# Altium integrated library GPDSE.IntLib: 634 symbols (part 7 of 7)
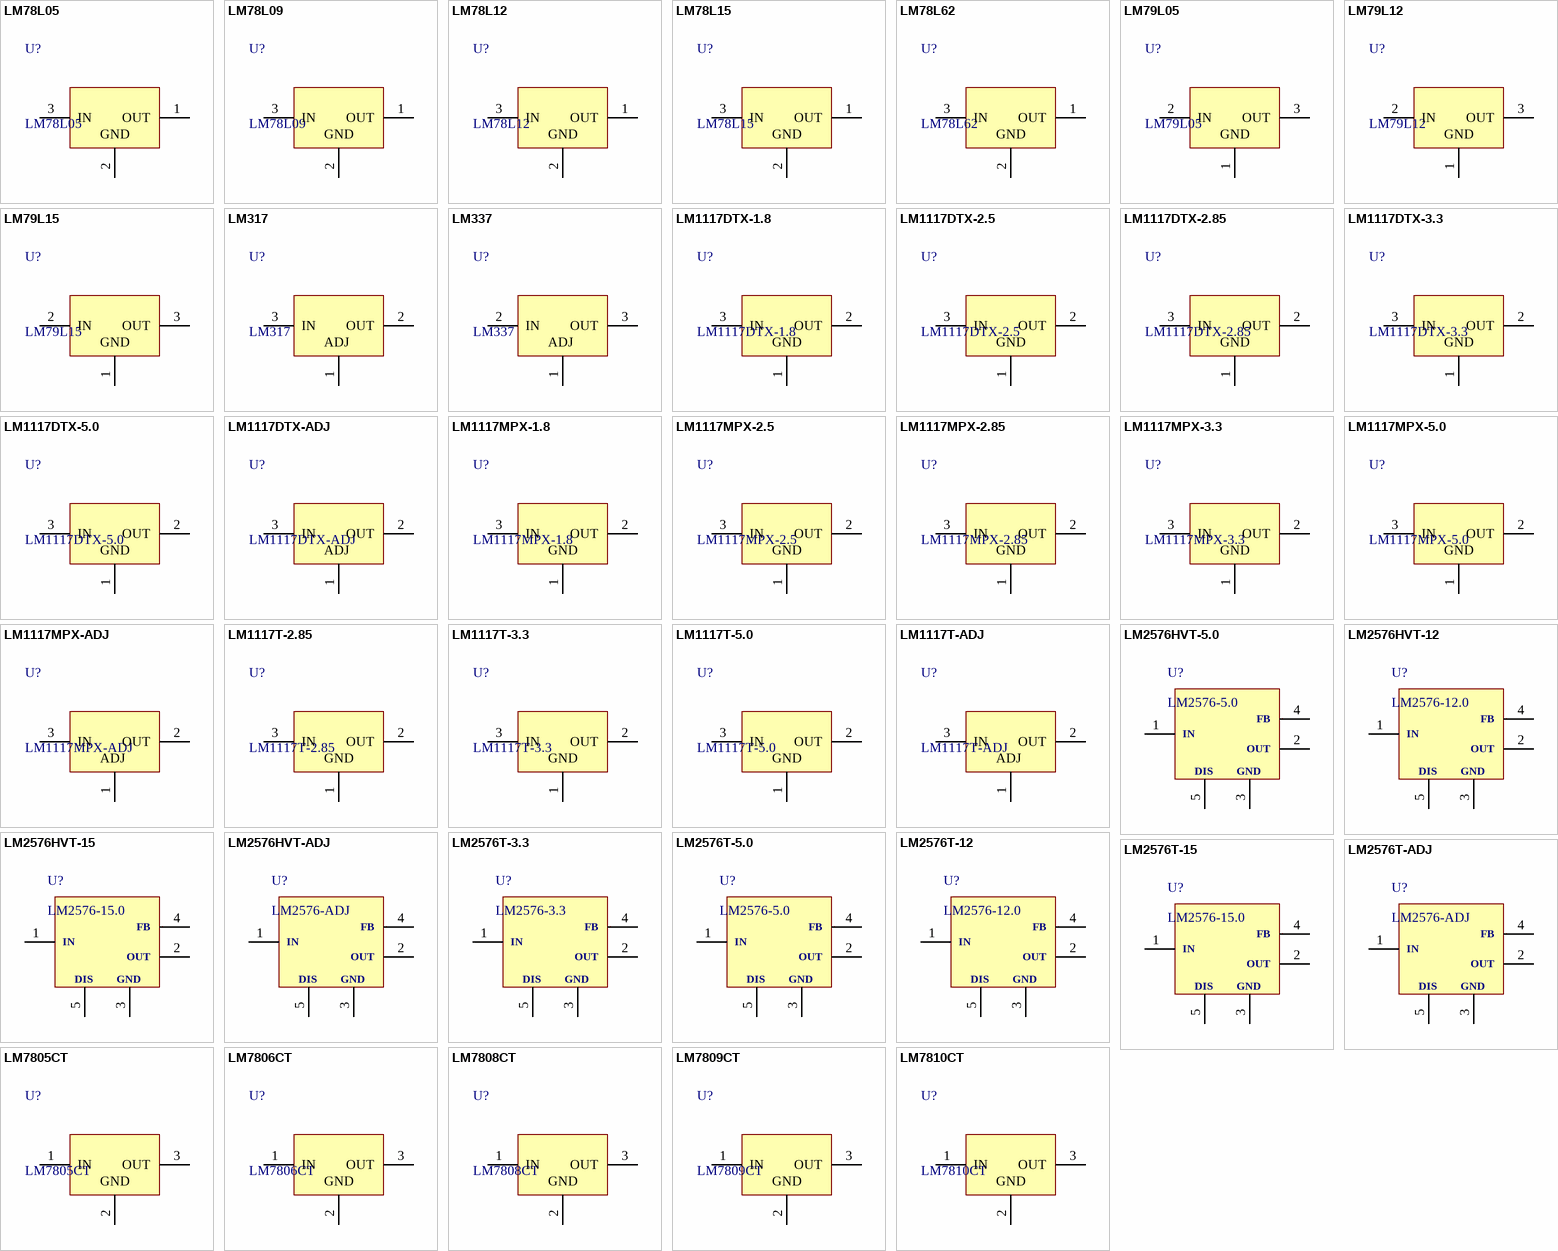
[diagram p41: symbols LM78L05 to LM7810CT]

## LM7806CT
designator U?
3-Terminal 1 A Positive 6 V Voltage Regulator
footprint TO-220/123 (TO, Thru-Hole, Vertical, Heatsink Mounted; 3 In-Line Leads; Pitch 2.54 mm)
pins: 1 IN, 2 GND, 3 OUT

## LM7808CT
designator U?
3-Terminal 1 A Positive 8 V Voltage Regulator
footprint TO-220/123 (TO, Thru-Hole, Vertical, Heatsink Mounted; 3 In-Line Leads; Pitch 2.54 mm)
pins: 1 IN, 2 GND, 3 OUT

## LM7809CT
designator U?
3-Terminal 1 A Positive 9 V Voltage Regulator
footprint TO-220/123 (TO, Thru-Hole, Vertical, Heatsink Mounted; 3 In-Line Leads; Pitch 2.54 mm)
pins: 1 IN, 2 GND, 3 OUT

## LM7810CT
designator U?
3-Terminal 1 A Positive 10 V Voltage Regulator
footprint TO-220/123 (TO, Thru-Hole, Vertical, Heatsink Mounted; 3 In-Line Leads; Pitch 2.54 mm)
pins: 1 IN, 2 GND, 3 OUT

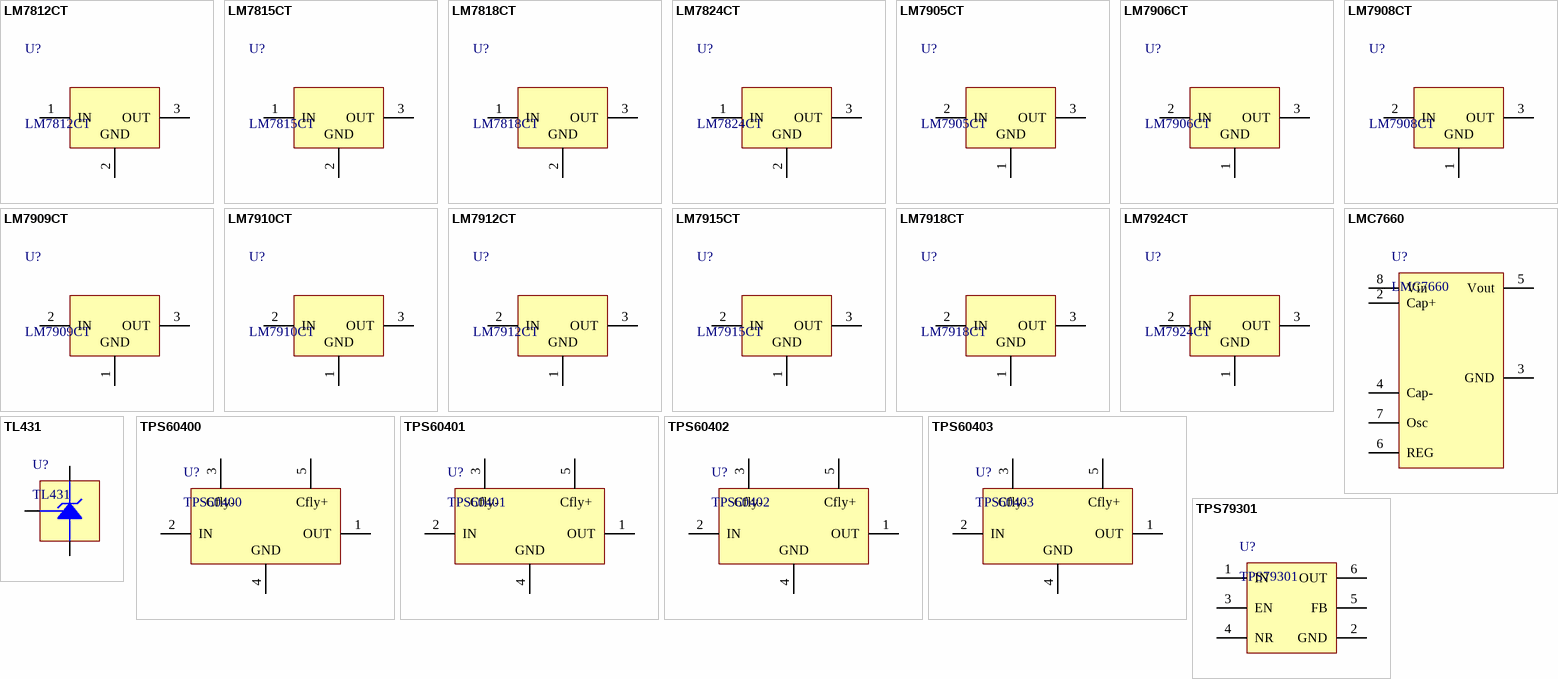
[diagram p33: symbols LM7812CT to TPS79301]

## LM7812CT
designator U?
3-Terminal 1 A Positive 12 V Voltage Regulator
footprint TO-220/123 (TO, Thru-Hole, Vertical, Heatsink Mounted; 3 In-Line Leads; Pitch 2.54 mm)
pins: 1 IN, 2 GND, 3 OUT

## LM7815CT
designator U?
3-Terminal 1 A Positive 15 V Voltage Regulator
footprint TO-220/123 (TO, Thru-Hole, Vertical, Heatsink Mounted; 3 In-Line Leads; Pitch 2.54 mm)
pins: 1 IN, 2 GND, 3 OUT

## LM7818CT
designator U?
3-Terminal 1 A Positive 18 V Voltage Regulator
footprint TO-220/123 (TO, Thru-Hole, Vertical, Heatsink Mounted; 3 In-Line Leads; Pitch 2.54 mm)
pins: 1 IN, 2 GND, 3 OUT

## LM7824CT
designator U?
3-Terminal 1 A Positive 24 V Voltage Regulator
footprint TO-220/123 (TO, Thru-Hole, Vertical, Heatsink Mounted; 3 In-Line Leads; Pitch 2.54 mm)
pins: 1 IN, 2 GND, 3 OUT

## LM7905CT
designator U?
3-Terminal 1 A Negative 5 V Voltage Regulator
footprint TO-220/123 (TO, Thru-Hole, Vertical, Heatsink Mounted; 3 In-Line Leads; Pitch 2.54 mm)
pins: 1 GND, 2 IN, 3 OUT

## LM7906CT
designator U?
3-Terminal 1 A Negative 6 V Voltage Regulator
footprint TO-220/123 (TO, Thru-Hole, Vertical, Heatsink Mounted; 3 In-Line Leads; Pitch 2.54 mm)
pins: 1 GND, 2 IN, 3 OUT

## LM7908CT
designator U?
3-Terminal 1 A Negative 8 V Voltage Regulator
footprint TO-220/123 (TO, Thru-Hole, Vertical, Heatsink Mounted; 3 In-Line Leads; Pitch 2.54 mm)
pins: 1 GND, 2 IN, 3 OUT

## LM7909CT
designator U?
3-Terminal 1 A Negative 9 V Voltage Regulator
footprint TO-220/123 (TO, Thru-Hole, Vertical, Heatsink Mounted; 3 In-Line Leads; Pitch 2.54 mm)
pins: 1 GND, 2 IN, 3 OUT

## LM7910CT
designator U?
3-Terminal 1 A Negative 10 V Voltage Regulator
footprint TO-220/123 (TO, Thru-Hole, Vertical, Heatsink Mounted; 3 In-Line Leads; Pitch 2.54 mm)
pins: 1 GND, 2 IN, 3 OUT

## LM7912CT
designator U?
3-Terminal 1 A Negative 12 V Voltage Regulator
footprint TO-220/123 (TO, Thru-Hole, Vertical, Heatsink Mounted; 3 In-Line Leads; Pitch 2.54 mm)
pins: 1 GND, 2 IN, 3 OUT

## LM7915CT
designator U?
3-Terminal 1 A Negative 15 V Voltage Regulator
footprint TO-220/123 (TO, Thru-Hole, Vertical, Heatsink Mounted; 3 In-Line Leads; Pitch 2.54 mm)
pins: 1 GND, 2 IN, 3 OUT

## LM7918CT
designator U?
3-Terminal 1 A Negative 18 V Voltage Regulator
footprint TO-220/123 (TO, Thru-Hole, Vertical, Heatsink Mounted; 3 In-Line Leads; Pitch 2.54 mm)
pins: 1 GND, 2 IN, 3 OUT

## LM7924CT
designator U?
3-Terminal 1 A Negative 24 V Voltage Regulator
footprint TO-220/123 (TO, Thru-Hole, Vertical, Heatsink Mounted; 3 In-Line Leads; Pitch 2.54 mm)
pins: 1 GND, 2 IN, 3 OUT

## LMC7660
designator U?
Switched Capacitor Voltage Converter
footprint DIP08-300(100) (DIP; 8 Leads; Row Spacing 7.62 mm; Pitch 2.54 mm)
footprint SOIC08-150(50) (SOIC 8 Leads; Row Spacing 3.81 mm; Pitch 1.27 mm; 3D André L´Hérault)
pins: 2 Cap+, 3 GND, 4 Cap-, 5 Vout, 6 REG, 7 Osc, 8 Vin

## TL431
designator U?
Precision Programmable Reference
footprint TO-92/123 (Transistor Outline Package, Case Style 92 123; 3D Sergey Atanov)
footprint SOT-23/3 (Small Outline Transistor 3 leads); pin to pad 1>2 2>3 3>1
footprint SOT-23/5 (Small Outline Transistor 5 leads); pin to pad 1>4 2>5
footprint SOIC08-150(50) (SOIC 8 Leads; Row Spacing 3.81 mm; Pitch 1.27 mm; 3D André L´Hérault); pin to pad 1>8 2>6 3>1
footprint SC-70/5 (Thin Shrink Small Outline Transistor Package 5 leads); pin to pad 1>3 2>5 3>1
footprint DIP08-300(100) (DIP; 8 Leads; Row Spacing 7.62 mm; Pitch 2.54 mm); pin to pad 1>8 2>6 3>1
pins: 1 REF, 2 A, 3 K

## TPS60400
designator U?
Unregulated 60-mA Charge Pump Voltage Inverter
footprint SOT-23/5 (Small Outline Transistor 5 leads)
pins: 1 OUT, 2 IN, 3 Cfly-, 4 GND, 5 Cfly+

## TPS60401
designator U?
Unregulated 60-mA Charge Pump Voltage Inverter
footprint SOT-23/5 (Small Outline Transistor 5 leads)
pins: 1 OUT, 2 IN, 3 Cfly-, 4 GND, 5 Cfly+

## TPS60402
designator U?
Unregulated 60-mA Charge Pump Voltage Inverter
footprint SOT-23/5 (Small Outline Transistor 5 leads)
pins: 1 OUT, 2 IN, 3 Cfly-, 4 GND, 5 Cfly+

## TPS60403
designator U?
Unregulated 60-mA Charge Pump Voltage Inverter
footprint SOT-23/5 (Small Outline Transistor 5 leads)
pins: 1 OUT, 2 IN, 3 Cfly-, 4 GND, 5 Cfly+

## TPS79301
designator U?
Low-Noise, High PSRR, RF, 200-mA Low-Dropout Linear Regulators
footprint SOT-23/6 (Small Outline Transistor 6 leads)
pins: 1 IN, 2 GND, 3 EN, 4 NR, 5 FB, 6 OUT


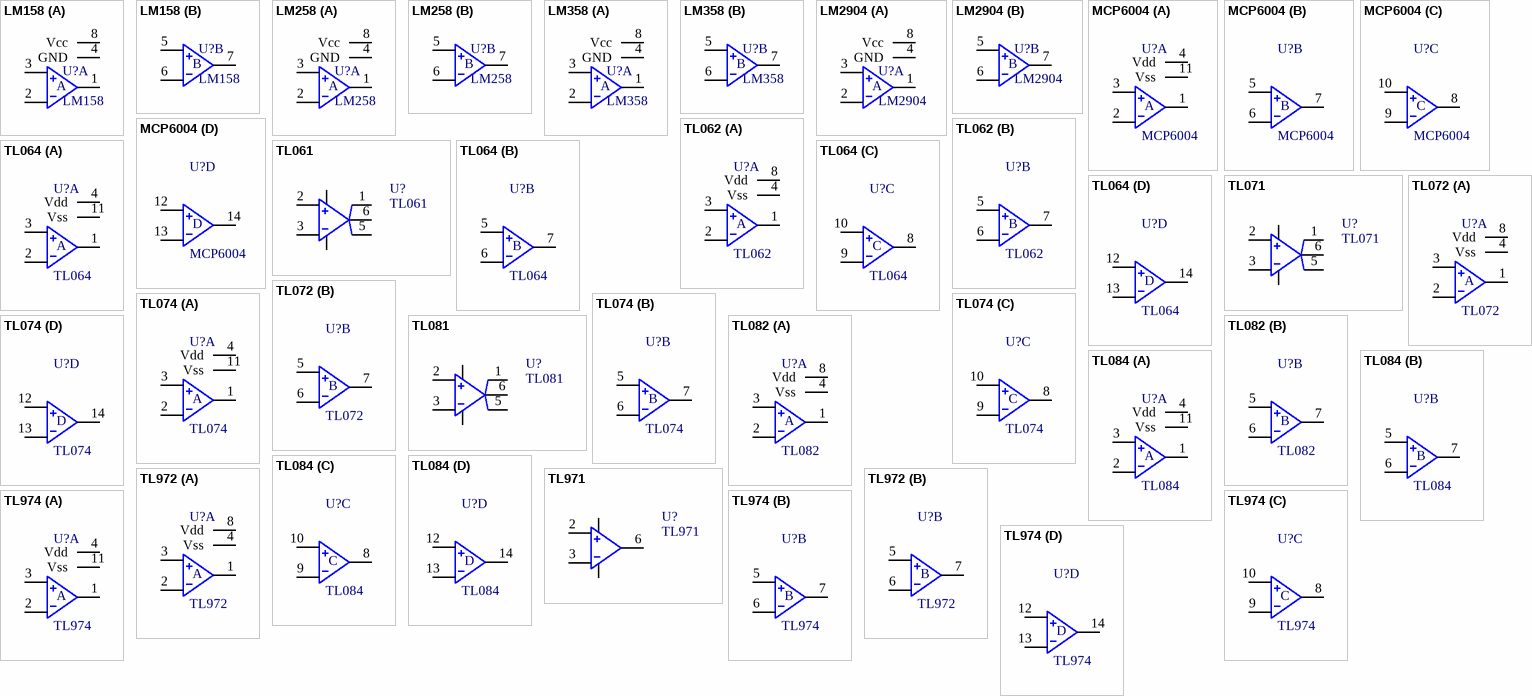
[diagram p34: symbols LM158 to TL974]

## LM158
designator U?
Dual Operational Amplifier
footprint DIP08-300(100) (DIP; 8 Leads; Row Spacing 7.62 mm; Pitch 2.54 mm)
part A pins: 1 O1, 2 IN1-, 3 IN1+, 4 GND (power), 8 Vcc (power)
part B pins: 5 IN2+, 6 IN2-, 7 O2
part A text: A
part B text: B

## LM258
designator U?
Dual Operational Amplifier
footprint DIP08-300(100) (DIP; 8 Leads; Row Spacing 7.62 mm; Pitch 2.54 mm)
footprint SOIC08-150(50) (Plastic Small Outline 8 pinos)
footprint SOP08-2.8mm(0.65mm) (Small Outline Package; 8 leads; Row Spacing 2.8 mm; Pitch 0.65 mm)
part A pins: 1 O1, 2 IN1-, 3 IN1+, 4 GND (power), 8 Vcc (power)
part B pins: 5 IN2+, 6 IN2-, 7 O2
part A text: A
part B text: B

## LM358
designator U?
Dual Operational Amplifier
footprint DIP08-300(100) (DIP; 8 Leads; Row Spacing 7.62 mm; Pitch 2.54 mm)
footprint SOIC08-150(50) (Plastic Small Outline 8 pinos)
footprint SOP08-2.8mm(0.65mm) (Small Outline Package; 8 leads; Row Spacing 2.8 mm; Pitch 0.65 mm)
footprint SOP08-4.4mm(0.65mm) (Thin Shrink Small Outline Package 8 pin)
footprint SOP08-5.3mm(1.27mm) (Small Outline Package 8 pin)
part A pins: 1 O1, 2 IN1-, 3 IN1+, 4 GND (power), 8 Vcc (power)
part B pins: 5 IN2+, 6 IN2-, 7 O2
part A text: A
part B text: B

## LM2904
designator U?
Dual Operational Amplifier
footprint DIP08-300(100) (DIP; 8 Leads; Row Spacing 7.62 mm; Pitch 2.54 mm)
footprint SOIC08-150(50) (Plastic Small Outline 8 pinos)
footprint SOP08-2.8mm(0.65mm) (Small Outline Package; 8 leads; Row Spacing 2.8 mm; Pitch 0.65 mm)
footprint SOP08-4.4mm(0.65mm) (Thin Shrink Small Outline Package 8 pin)
footprint SOP08-5.3mm(1.27mm) (Small Outline Package 8 pin)
part A pins: 1 O1, 2 IN1-, 3 IN1+, 4 GND (power), 8 Vcc (power)
part B pins: 5 IN2+, 6 IN2-, 7 O2
part A text: A
part B text: B

## MCP6004
designator U?
1 MHz, Low-Power Op Amp
footprint DIP14-300(100) (DIP, 14-Leads, Row Spacing 7.62mm, Pitch 2.54mm)
footprint SOIC14-150(50) (SOIC 14 Leads; Row Spacing 3.81 mm; Pitch 1.27 mm; 3D André L´Hérault)
footprint SOP14-4.4mm(0.65mm) (Thin Shrink Small Outline Package 14 pin)
part A pins: 1 O1, 2 IN1-, 3 IN1+, 4 Vdd (power), 11 Vss (power)
part B pins: 5 IN2+, 6 IN2-, 7 O2
part C pins: 8 O3, 9 IN3-, 10 IN3+
part D pins: 12 IN4+, 13 IN4-, 14 O4
part A text: A
part B text: B
part C text: C
part D text: D

## TL061
designator U?
Low-Noise JFET-Input Operational Amplifier
footprint DIP08-300(100) (DIP; 8 Leads; Row Spacing 7.62 mm; Pitch 2.54 mm)
footprint SOIC08-150(50) (SOIC 8 Leads; Row Spacing 3.81 mm; Pitch 1.27 mm; 3D André L´Hérault)
footprint SOP08-5.3mm(1.27mm) (Small Outline Package 8 pin)
pins: 1 OS1, 2 IN+, 3 IN-, 4 Vss, 5 OS2, 6 O, 7 Vdd

## TL062
designator U?
Dual Low-Noise JFET-Input Operational Amplifier
footprint DIP08-300(100) (DIP; 8 Leads; Row Spacing 7.62 mm; Pitch 2.54 mm)
footprint SOIC08-150(50) (SOIC 8 Leads; Row Spacing 3.81 mm; Pitch 1.27 mm; 3D André L´Hérault)
footprint SOP08-4.4mm(0.65mm) (Thin Shrink Small Outline Package 8 pin)
footprint SOP08-5.3mm(1.27mm) (Small Outline Package 8 pin)
part A pins: 1 O1, 2 IN1-, 3 IN1+, 4 Vss (power), 8 Vdd (power)
part B pins: 5 IN2+, 6 IN2-, 7 O2
part A text: A
part B text: B

## TL064
designator U?
Quad Low-Noise JFET-Input Operational Amplifier
footprint DIP14-300(100) (DIP, 14-Leads, Row Spacing 7.62mm, Pitch 2.54mm)
footprint SOIC14-150(50) (SOIC 14 Leads; Row Spacing 3.81 mm; Pitch 1.27 mm; 3D André L´Hérault)
footprint SOP14-4.4mm(0.65mm) (Thin Shrink Small Outline Package 14 pin)
footprint SOP14-5.3mm(1.27mm) (Small Outline Package 14 pin)
part A pins: 1 O1, 2 IN1-, 3 IN1+, 4 Vdd (power), 11 Vss (power)
part B pins: 5 IN2+, 6 IN2-, 7 O2
part C pins: 8 O3, 9 IN3-, 10 IN3+
part D pins: 12 IN4+, 13 IN4-, 14 O4
part A text: A
part B text: B
part C text: C
part D text: D

## TL071
designator U?
Low-Noise JFET-Input Operational Amplifier
footprint DIP08-300(100) (DIP; 8 Leads; Row Spacing 7.62 mm; Pitch 2.54 mm)
footprint SOIC08-150(50) (SOIC 8 Leads; Row Spacing 3.81 mm; Pitch 1.27 mm; 3D André L´Hérault)
footprint SOP08-5.3mm(1.27mm) (Small Outline Package 8 pin)
pins: 1 OS1, 2 IN+, 3 IN-, 4 Vss, 5 OS2, 6 O, 7 Vdd

## TL072
designator U?
Dual Low-Noise JFET-Input Operational Amplifier
footprint DIP08-300(100) (DIP; 8 Leads; Row Spacing 7.62 mm; Pitch 2.54 mm)
footprint SOIC08-150(50) (SOIC 8 Leads; Row Spacing 3.81 mm; Pitch 1.27 mm; 3D André L´Hérault)
footprint SOP08-4.4mm(0.65mm) (Thin Shrink Small Outline Package 8 pin)
footprint SOP08-5.3mm(1.27mm) (Small Outline Package 8 pin)
part A pins: 1 O1, 2 IN1-, 3 IN1+, 4 Vss (power), 8 Vdd (power)
part B pins: 5 IN2+, 6 IN2-, 7 O2
part A text: A
part B text: B

## TL074
designator U?
Quad Low-Noise JFET-Input Operational Amplifier
footprint DIP14-300(100) (DIP, 14-Leads, Row Spacing 7.62mm, Pitch 2.54mm)
footprint SOIC14-150(50) (SOIC 14 Leads; Row Spacing 3.81 mm; Pitch 1.27 mm; 3D André L´Hérault)
footprint SOP14-4.4mm(0.65mm) (Thin Shrink Small Outline Package 14 pin)
footprint SOP14-5.3mm(1.27mm) (Small Outline Package 14 pin)
part A pins: 1 O1, 2 IN1-, 3 IN1+, 4 Vdd (power), 11 Vss (power)
part B pins: 5 IN2+, 6 IN2-, 7 O2
part C pins: 8 O3, 9 IN3-, 10 IN3+
part D pins: 12 IN4+, 13 IN4-, 14 O4
part A text: A
part B text: B
part C text: C
part D text: D

## TL081
designator U?
JFET-Input Operational Amplifier
footprint DIP08-300(100) (DIP; 8 Leads; Row Spacing 7.62 mm; Pitch 2.54 mm)
footprint SOIC08-150(50) (SOIC 8 Leads; Row Spacing 3.81 mm; Pitch 1.27 mm; 3D André L´Hérault)
footprint SOP08-5.3mm(1.27mm) (Small Outline Package 8 pin)
pins: 1 OS1, 2 IN+, 3 IN-, 4 Vss, 5 OS2, 6 O, 7 Vdd

## TL082
designator U?
Dual JFET-Input Operational Amplifier
footprint DIP08-300(100) (DIP; 8 Leads; Row Spacing 7.62 mm; Pitch 2.54 mm)
footprint SOIC08-150(50) (SOIC 8 Leads; Row Spacing 3.81 mm; Pitch 1.27 mm; 3D André L´Hérault)
footprint SOP08-4.4mm(0.65mm) (Thin Shrink Small Outline Package 8 pin)
footprint SOP08-5.3mm(1.27mm) (Small Outline Package 8 pin)
part A pins: 1 O1, 2 IN1-, 3 IN1+, 4 Vss (power), 8 Vdd (power)
part B pins: 5 IN2+, 6 IN2-, 7 O2
part A text: A
part B text: B

## TL084
designator U?
Quad JFET-Input Operational Amplifier
footprint DIP14-300(100) (DIP, 14-Leads, Row Spacing 7.62mm, Pitch 2.54mm)
footprint SOIC14-150(50) (SOIC 14 Leads; Row Spacing 3.81 mm; Pitch 1.27 mm; 3D André L´Hérault)
footprint SOP14-4.4mm(0.65mm) (Thin Shrink Small Outline Package 14 pin)
footprint SOP14-5.3mm(1.27mm) (Small Outline Package 14 pin)
part A pins: 1 O1, 2 IN1-, 3 IN1+, 4 Vdd (power), 11 Vss (power)
part B pins: 5 IN2+, 6 IN2-, 7 O2
part C pins: 8 O3, 9 IN3-, 10 IN3+
part D pins: 12 IN4+, 13 IN4-, 14 O4
part A text: A
part B text: B
part C text: C
part D text: D

## TL971
designator U?
Output Rail-toRail Very-Low-Noise Operational Amplifier
footprint SOIC08-150(50) (SOIC 8 Leads; Row Spacing 3.81 mm; Pitch 1.27 mm; 3D André L´Hérault)
footprint SOT-23/5 (Small Outline Transistor 5 leads); pin to pad 2>4 4>2 6>1 7>5
pins: 2 IN+, 3 IN-, 4 Vss, 6 O, 7 Vdd

## TL972
designator U?
Dual Output Rail-toRail Very-Low-Noise Operational Amplifier
footprint DIP08-300(100) (DIP; 8 Leads; Row Spacing 7.62 mm; Pitch 2.54 mm)
footprint SOIC08-150(50) (SOIC 8 Leads; Row Spacing 3.81 mm; Pitch 1.27 mm; 3D André L´Hérault)
footprint SOP08-4.4mm(0.65mm) (Thin Shrink Small Outline Package 8 pin)
footprint SOP08-2.8mm(0.65mm) (Small Outline Package; 8 leads; Row Spacing 2.8 mm; Pitch 0.65 mm)
part A pins: 1 O1, 2 IN1-, 3 IN1+, 4 Vss (power), 8 Vdd (power)
part B pins: 5 IN2+, 6 IN2-, 7 O2
part A text: A
part B text: B

## TL974
designator U?
Quad Output Rail-toRail Very-Low-Noise Operational Amplifier
footprint DIP14-300(100) (DIP, 14-Leads, Row Spacing 7.62mm, Pitch 2.54mm)
footprint SOIC14-150(50) (SOIC 14 Leads; Row Spacing 3.81 mm; Pitch 1.27 mm; 3D André L´Hérault)
footprint SOP14-4.4mm(0.65mm) (Thin Shrink Small Outline Package 14 pin)
part A pins: 1 O1, 2 IN1-, 3 IN1+, 4 Vdd (power), 11 Vss (power)
part B pins: 5 IN2+, 6 IN2-, 7 O2
part C pins: 8 O3, 9 IN3-, 10 IN3+
part D pins: 12 IN4+, 13 IN4-, 14 O4
part A text: A
part B text: B
part C text: C
part D text: D


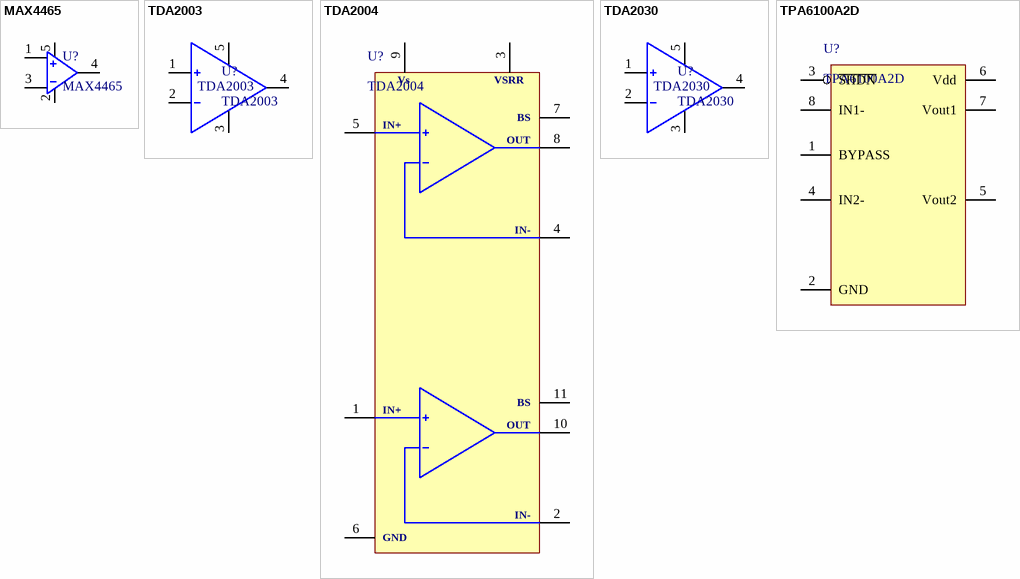
[diagram p35: symbols MAX4465 to TPA6100A2D]

## MAX4465
designator U?
Low-Cost, Micropower, Microphone Preamplifier with Complete Shutdown
footprint SOT-23/5 (Small Outline Transistor 5 leads)
footprint SC-70/5 (Thin Shrink Small Outline Transistor Package 5 leads)
pins: 1 IN+, 2 GND, 3 IN-, 4 OUT, 5 Vcc

## TDA2003
designator U?
10 W Car Radio Audio Amplifier
footprint TO-220-5 (TO, Thru-Hole, Vertical, Heatsink Mounted; 5 Zig-Zag Leads; Pitch 1.7 mm)
pins: 1 IN+, 2 IN-, 3 GND (power), 4 OUT, 5 Vs (power)

## TDA2004
designator U?
10 + 10 W Stereo Amplifier for Car Radio
footprint TO-220-11 (TO, Thru-Hole, Vertical, Heatsink Mounted; 11 Zig-Zag Leads; Pitch 1.7 mm)
pins: 1 IN2+, 2 IN2-, 3 VSRR (power), 4 IN1-, 5 IN1+, 6 GND (power), 7 Bootstrap2, 8 OUT1, 9 Vs (power), 10 OUT2, 11 Bootstrap1
text: BS; IN+; OUT; IN-

## TDA2030
designator U?
14 W Hi-Fi Audio Amplifier; Manufacturer: STMicroelectronics; Manufacturer Part Number: TDA2030AV; Input Type: Differential; Output Current: 3500 mA; Output Power: 18 W; Supply Current: 80 mA; Supply Type: Dual; Gain: 80 dB; Number of Channels: 1 Channel; THD plus Noise: 0.5 %; Audio Load Resistance: 8 Ohm; Class: Class-AB; Ib - Input Bias Current: 2 uA; Pd - Power Dissipation: 20000 mW; PSRR - Power Supply Rejection Ratio: 54 dB; Vos - Input Offset Voltage: 15 V; Product Status: Obsolete; Supplier 1: Mouser; Supplier Part Number 1: 511-TDA2030AV; RoHS: RoHS Compliant; Category: Audio Amplifiers; Stock 1: 0; Package / Case: Pentawatt; Packaging: Tube; Product: Audio Amplifiers; Series: TDA2030A; Type: 1-Channel Mono; Brand: STMicroelectronics; Mounting Style: Through Hole; Maximum Operating Temperature: + 150 C; Minimum Operating Temperature: - 40 C; Product Category: Audio Integrated Circuits; Standard Pack Qty: 50; RoHS - Mouser: Y; Minimum Order Quantity: 1; Reeling: False; ComponentLink1URL: http://www.mouser.com/ds/2/389/stmicroelectronics_cd00000129-329572.pdf; ComponentLink1Description: http://www.mouser.com/ds/2/389/stmicroelectronics_cd00000129-329572.pdf
footprint TO-220-5 (TO, Thru-Hole, Vertical, Heatsink Mounted; 5 Zig-Zag Leads; Pitch 1.7 mm)
pins: 1 IN+, 2 IN-, 3 GND (power), 4 OUT, 5 Vs (power)

## TPA6100A2D
designator U?
50-mW Uktralow Voltage Stereo Headphone Audio Power Amplifier
footprint SOP08-2.8mm(0.65mm) (Small Outline Package; 8 leads; Row Spacing 2.8 mm; Pitch 0.65 mm)
footprint SOIC08-150(50) (SOIC 8 Leads; Row Spacing 3.81 mm; Pitch 1.27 mm; 3D André L´Hérault)
pins: 1 BYPASS, 2 GND (power), 3 ~{SHDN}, 4 IN2-, 5 Vout2, 6 Vdd (power), 7 Vout1, 8 IN1-